# Altium footprint library 4.30-KF-5.08连接器.PcbLib: 147 footprints (part 9 of 10)
Each footprint in its own frame and in the unit in brackets; x right, y up, seen from the top. Pads: shape width x height; smd on the part's side, far side on the other; paste and mask are expansions set on the pad; w line width, h text height; cw(c..) or ccw(c..) is an arc to the next point about the centre after c.
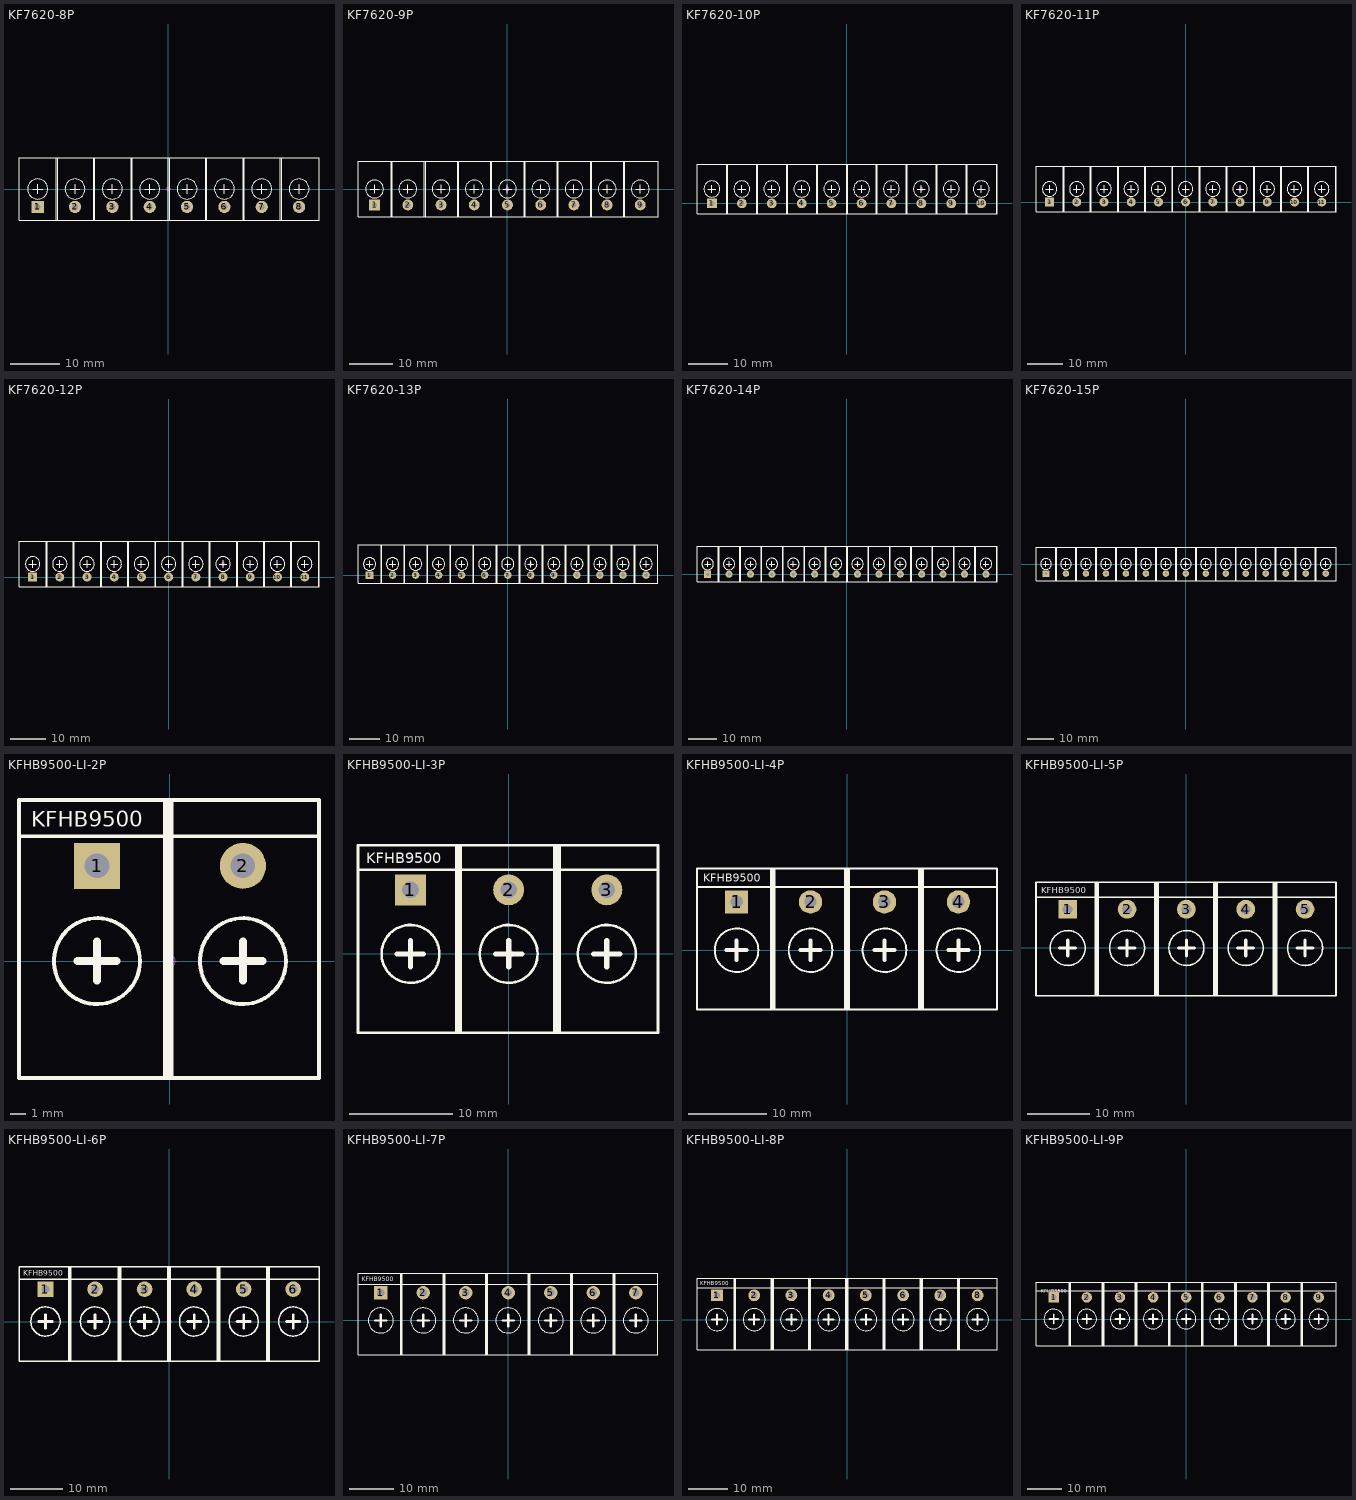
[diagram p8: the footprints below, top view; thin cyan lines are the x and y axes]

## KF7620-8P [mm] "61*12*12mm(长宽高)"
pads (8):
  rect 2.5x2.5 hole 1.2: 1(-26.67,-3.65)
  round 2.5 hole 1.2: 2(-19.05,-3.65) 3(-11.43,-3.65) 4(-3.81,-3.65) 5(3.81,-3.65) 6(11.43,-3.65) 7(19.05,-3.65) 8(26.67,-3.65)
Top Overlay:
  circle w0.254: c26.67,0 r2.048
  circle w0.254: c19.05,0 r2.048
  circle w0.254: c3.81,0 r2.048
  circle w0.254: c11.43,0 r2.048
  circle w0.254: c-19.05,0 r2.048
  circle w0.254: c-26.67,0 r2.048
  circle w0.254: c-11.43,0 r2.048
  circle w0.254: c-3.81,0 r2.048
  lines w0.254: -27.686,0 -25.654,0 ; -26.67,-1.016 -26.67,1.016 ; -22.86,-6.35 -22.86,6.35 ; -22.606,6.35 -22.606,-6.35 -22.352,-6.35 ; -20.066,0 -18.034,0 ; -19.05,-1.016 -19.05,1.016 ; -12.446,0 -10.414,0 ; -11.43,-1.016 -11.43,1.016 ; -7.62,-6.35 -7.62,6.35 ; -7.366,6.35 -7.366,-6.35 -7.112,-6.35 ; -4.826,0 -2.794,0 ; -3.81,-1.016 -3.81,1.016 ; 2.794,0 4.826,0 ; 3.81,-1.016 3.81,1.016 ; 7.62,-6.35 7.62,6.35 ; 7.874,6.35 7.874,-6.35 8.128,-6.35 ; 10.414,0 12.446,0 ; 11.43,-1.016 11.43,1.016 ; 18.034,0 20.066,0 ; 19.05,-1.016 19.05,1.016 ; 22.86,-6.35 22.86,6.35 ; 23.114,6.35 23.114,-6.35 23.368,-6.35 ; 25.654,0 27.686,0 ; 26.67,-1.016 26.67,1.016 ; -30.48,-6.35 -30.48,6.35 -14.986,6.35 -14.986,-6.35 -30.48,-6.35 ; -15.24,-6.35 0.254,-6.35 0.254,6.35 -15.24,6.35 -15.24,-6.35 ; 0,-6.35 15.494,-6.35 15.494,6.35 0,6.35 0,-6.35 ; 15.24,-6.35 15.24,6.35 30.734,6.35 30.734,-6.35 15.24,-6.35
Mechanical 15:
  circle w0.05: c0,0 r0.35
  lines w0.05: -0.5,0 0.5,0 ; 0,-0.5 0,0.5
3D body: height 12.45, standoff -3.45, extent -30.48,-6.2 -22.16,6.2
3D body: height 12.45, standoff -3.45, extent -22.86,-6.2 -14.54,6.2
3D body: height 12.45, standoff -3.45, extent -15.24,-6.2 -6.92,6.2
3D body: height 12.45, standoff -3.45, extent -7.62,-6.2 0.7,6.2
3D body: height 12.45, standoff -3.45, extent 0,-6.2 8.32,6.2
3D body: height 12.45, standoff -3.45, extent 7.62,-6.2 15.94,6.2
3D body: height 12.45, standoff -3.45, extent 15.24,-6.2 23.56,6.2
3D body: height 12.45, standoff -3.45, extent 22.86,-6.2 31.18,6.2

## KF7620-9P [mm] "61*12*12mm(长宽高)"
pads (9):
  rect 2.5x2.5 hole 1.2: 1(-30.48,-3.65)
  round 2.5 hole 1.2: 2(-22.86,-3.65) 3(-15.24,-3.65) 4(-7.62,-3.65) 5(0,-3.65) 6(7.62,-3.65) 7(15.24,-3.65) 8(22.86,-3.65) 9(30.46,-3.65)
Top Overlay:
  circle w0.254: c-7.62,0 r2.048
  circle w0.254: c-15.24,0 r2.048
  circle w0.254: c-30.48,0 r2.048
  circle w0.254: c-22.86,0 r2.048
  circle w0.254: c7.62,0 r2.048
  circle w0.254: c0,0 r2.048
  circle w0.254: c15.24,0 r2.048
  circle w0.254: c22.86,0 r2.048
  circle w0.254: c30.46,0 r2.048
  lines w0.254: -31.496,0 -29.464,0 ; -30.48,-1.016 -30.48,1.016 ; -26.67,-6.35 -26.67,6.35 ; -26.416,6.35 -26.416,-6.35 -26.162,-6.35 ; -23.876,0 -21.844,0 ; -22.86,-1.016 -22.86,1.016 ; -16.256,0 -14.224,0 ; -15.24,-1.016 -15.24,1.016 ; -11.43,-6.35 -11.43,6.35 ; -11.176,6.35 -11.176,-6.35 -10.922,-6.35 ; -8.636,0 -6.604,0 ; -7.62,-1.016 -7.62,1.016 ; -1.016,0 1.016,0 ; 0,-1.016 0,1.016 ; 3.81,-6.35 3.81,6.35 ; 4.064,6.35 4.064,-6.35 4.318,-6.35 ; 6.604,0 8.636,0 ; 7.62,-1.016 7.62,1.016 ; 14.224,0 16.256,0 ; 15.24,-1.016 15.24,1.016 ; 19.05,-6.35 19.05,6.35 ; 19.304,6.35 19.304,-6.35 19.558,-6.35 ; 21.844,0 23.876,0 ; 22.86,-1.016 22.86,1.016 ; 26.65,-6.35 26.65,6.35 ; 27.158,-6.35 26.904,-6.35 ; 29.444,0 31.476,0 ; 30.46,-1.016 30.46,1.016 ; 26.904,-6.35 26.904,6.35 34.524,6.35 34.524,-6.35 26.904,-6.35 ; 26.924,-6.35 26.924,6.35 ; 26.924,-6.35 11.43,-6.35 11.43,6.35 26.924,6.35 ; 26.924,-6.35 26.924,6.35 ; 26.924,-6.35 26.924,6.35 ; -34.29,-6.35 -18.796,-6.35 -18.796,6.35 -34.29,6.35 -34.29,-6.35 ; -19.05,-6.35 -19.05,6.35 -3.556,6.35 -3.556,-6.35 -19.05,-6.35 ; -3.81,-6.35 -3.81,6.35 11.684,6.35 11.684,-6.35 -3.81,-6.35
Mechanical 15:
  circle w0.05: c0,0 r0.35
  lines w0.05: -0.5,0 0.5,0 ; 0,-0.5 0,0.5
3D body: height 12.45, standoff -3.45, extent -34.29,-6.2 -25.97,6.2
3D body: height 12.45, standoff -3.45, extent -26.67,-6.2 -18.35,6.2
3D body: height 12.45, standoff -3.45, extent -19.05,-6.2 -10.73,6.2
3D body: height 12.45, standoff -3.45, extent -11.43,-6.2 -3.11,6.2
3D body: height 12.45, standoff -3.45, extent -3.81,-6.2 4.51,6.2
3D body: height 12.45, standoff -3.45, extent 3.81,-6.2 12.13,6.2
3D body: height 12.45, standoff -3.45, extent 11.43,-6.2 19.75,6.2
3D body: height 12.45, standoff -3.45, extent 19.05,-6.2 27.37,6.2
3D body: height 12.45, standoff -3.45, extent 26.67,-6.2 34.99,6.2

## KF7620-10P [mm] "61*12*12mm(长宽高)"
pads (10):
  rect 2.5x2.5 hole 1.2: 1(-34.29,0)
  round 2.5 hole 1.2: 2(-26.67,0) 3(-19.05,0) 4(-11.43,0) 5(-3.81,0) 6(3.81,0) 7(11.43,0) 8(19.05,0) 9(26.67,0) 10(34.29,0)
Top Overlay:
  circle w0.254: c26.67,3.65 r2.048
  circle w0.254: c34.29,3.65 r2.048
  circle w0.254: c-11.43,3.65 r2.048
  circle w0.254: c-19.05,3.65 r2.048
  circle w0.254: c-34.29,3.65 r2.048
  circle w0.254: c-26.67,3.65 r2.048
  circle w0.254: c3.81,3.65 r2.048
  circle w0.254: c-3.81,3.65 r2.048
  circle w0.254: c11.43,3.65 r2.048
  circle w0.254: c19.05,3.65 r2.048
  lines w0.254: -35.306,3.65 -33.274,3.65 ; -34.29,2.634 -34.29,4.666 ; -30.48,-2.7 -30.48,10 ; -30.226,10 -30.226,-2.7 -29.972,-2.7 ; -27.686,3.65 -25.654,3.65 ; -26.67,2.634 -26.67,4.666 ; -20.066,3.65 -18.034,3.65 ; -19.05,2.634 -19.05,4.666 ; -15.24,-2.7 -15.24,10 ; -14.986,10 -14.986,-2.7 -14.732,-2.7 ; -12.446,3.65 -10.414,3.65 ; -11.43,2.634 -11.43,4.666 ; -4.826,3.65 -2.794,3.65 ; -3.81,2.634 -3.81,4.666 ; 0,-2.7 0,10 ; 0.254,10 0.254,-2.7 0.508,-2.7 ; 2.794,3.65 4.826,3.65 ; 3.81,2.634 3.81,4.666 ; 10.414,3.65 12.446,3.65 ; 11.43,2.634 11.43,4.666 ; 15.24,-2.7 15.24,10 ; 15.494,10 15.494,-2.7 15.748,-2.7 ; 18.034,3.65 20.066,3.65 ; 19.05,2.634 19.05,4.666 ; 22.84,-2.7 22.84,10 ; 23.348,-2.7 23.094,-2.7 ; 25.654,3.65 27.686,3.65 ; 26.67,2.634 26.67,4.666 ; 30.44,-2.7 30.44,10 ; 30.948,-2.7 30.694,-2.7 ; 33.274,3.65 35.306,3.65 ; 34.29,2.634 34.29,4.666 ; 38.294,-2.7 38.294,10 ; 23.094,-2.7 23.094,10 30.714,10 ; 23.094,-2.7 30.714,-2.7 ; 30.694,-2.7 38.314,-2.7 ; 30.694,-2.7 30.694,10 38.314,10 ; 30.714,-2.7 30.714,10 ; 30.714,-2.7 30.714,10 ; 38.314,-2.7 38.314,10 ; 38.314,-2.7 38.314,10 ; -38.1,-2.7 -22.606,-2.7 -22.606,10 -38.1,10 -38.1,-2.7 ; -22.86,-2.7 -22.86,10 -7.366,10 -7.366,-2.7 -22.86,-2.7 ; -7.62,-2.7 -7.62,10 7.874,10 7.874,-2.7 -7.62,-2.7 ; 7.62,-2.7 23.114,-2.7 23.114,10 7.62,10 7.62,-2.7
Mechanical 15:
  circle w0.05: c19.05,3.65 r0.35
  lines w0.05: 18.55,3.65 19.55,3.65 ; 19.05,3.15 19.05,4.15
3D body: height 12.45, standoff -3.45, extent -38.1,-2.55 -29.78,9.85
3D body: height 12.45, standoff -3.45, extent -30.48,-2.55 -22.16,9.85
3D body: height 12.45, standoff -3.45, extent -22.86,-2.55 -14.54,9.85
3D body: height 12.45, standoff -3.45, extent -15.24,-2.55 -6.92,9.85
3D body: height 12.45, standoff -3.45, extent -7.62,-2.55 0.7,9.85
3D body: height 12.45, standoff -3.45, extent 0,-2.55 8.32,9.85
3D body: height 12.45, standoff -3.45, extent 7.62,-2.55 15.94,9.85
3D body: height 12.45, standoff -3.45, extent 15.24,-2.55 23.56,9.85
3D body: height 12.45, standoff -3.45, extent 22.86,-2.55 31.18,9.85
3D body: height 12.45, standoff -3.45, extent 30.48,-2.55 38.8,9.85

## KF7620-11P [mm] "61*12*12mm(长宽高)"
pads (11):
  rect 2.5x2.5 hole 1.2: 1(-38.1,0)
  round 2.5 hole 1.2: 2(-30.48,0) 3(-22.86,0) 4(-15.24,0) 5(-7.62,0) 6(0,0) 7(7.62,0) 8(15.24,0) 9(22.86,0) 10(30.48,0) 11(38.1,0)
Top Overlay:
  circle w0.254: c15.24,3.65 r2.048
  circle w0.254: c7.62,3.65 r2.048
  circle w0.254: c-7.62,3.65 r2.048
  circle w0.254: c0,3.65 r2.048
  circle w0.254: c-30.48,3.65 r2.048
  circle w0.254: c-38.1,3.65 r2.048
  circle w0.254: c-22.86,3.65 r2.048
  circle w0.254: c-15.24,3.65 r2.048
  circle w0.254: c30.48,3.65 r2.048
  circle w0.254: c38.1,3.65 r2.048
  circle w0.254: c22.86,3.65 r2.048
  lines w0.254: -39.116,3.65 -37.084,3.65 ; -38.1,2.634 -38.1,4.666 ; -34.29,-2.7 -34.29,10 ; -34.036,10 -34.036,-2.7 -33.782,-2.7 ; -31.496,3.65 -29.464,3.65 ; -30.48,2.634 -30.48,4.666 ; -23.876,3.65 -21.844,3.65 ; -22.86,2.634 -22.86,4.666 ; -19.05,-2.7 -19.05,10 ; -18.796,10 -18.796,-2.7 -18.542,-2.7 ; -16.256,3.65 -14.224,3.65 ; -15.24,2.634 -15.24,4.666 ; -8.636,3.65 -6.604,3.65 ; -7.62,2.634 -7.62,4.666 ; -3.81,-2.7 -3.81,10 ; -3.556,10 -3.556,-2.7 -3.302,-2.7 ; -1.016,3.65 1.016,3.65 ; 0,2.634 0,4.666 ; 6.604,3.65 8.636,3.65 ; 7.62,2.634 7.62,4.666 ; 11.43,-2.7 11.43,10 ; 11.684,10 11.684,-2.7 11.938,-2.7 ; 14.224,3.65 16.256,3.65 ; 15.24,2.634 15.24,4.666 ; 19.03,-2.7 19.03,10 ; 19.538,-2.7 19.284,-2.7 ; 21.844,3.65 23.876,3.65 ; 22.86,2.634 22.86,4.666 ; 26.63,-2.7 26.63,10 ; 27.138,-2.7 26.884,-2.7 ; 29.464,3.65 31.496,3.65 ; 30.48,2.634 30.48,4.666 ; 34.23,-2.7 34.23,10 ; 34.738,-2.7 34.484,-2.7 ; 37.084,3.65 39.116,3.65 ; 38.1,2.634 38.1,4.666 ; 42.084,-2.7 42.084,10 ; 19.284,-2.7 26.904,-2.7 ; 19.284,-2.7 19.284,10 26.904,10 ; 26.884,-2.7 26.884,10 34.504,10 ; 26.884,-2.7 34.504,-2.7 ; 26.904,-2.7 26.904,10 ; 26.904,-2.7 26.904,10 ; 34.484,-2.7 34.484,10 42.104,10 ; 34.484,-2.7 42.104,-2.7 ; 34.504,-2.7 34.504,10 ; 34.504,-2.7 34.504,10 ; 42.104,-2.7 42.104,10 ; 42.104,-2.7 42.104,10 ; -41.91,-2.7 -41.91,10 -26.416,10 -26.416,-2.7 -41.91,-2.7 ; -26.67,-2.7 -11.176,-2.7 -11.176,10 -26.67,10 -26.67,-2.7 ; -11.43,-2.7 4.064,-2.7 4.064,10 -11.43,10 -11.43,-2.7 ; 3.81,-2.7 3.81,10 19.304,10 19.304,-2.7 3.81,-2.7
Mechanical 15:
  circle w0.05: c15.24,3.65 r0.35
  lines w0.05: 14.74,3.65 15.74,3.65 ; 15.24,3.15 15.24,4.15
3D body: height 12.45, standoff -3.45, extent 26.67,-2.55 34.99,9.85
3D body: height 12.45, standoff -3.45, extent 19.05,-2.55 27.37,9.85
3D body: height 12.45, standoff -3.45, extent 11.43,-2.55 19.75,9.85
3D body: height 12.45, standoff -3.45, extent 3.81,-2.55 12.13,9.85
3D body: height 12.45, standoff -3.45, extent -3.81,-2.55 4.51,9.85
3D body: height 12.45, standoff -3.45, extent -11.43,-2.55 -3.11,9.85
3D body: height 12.45, standoff -3.45, extent -19.05,-2.55 -10.73,9.85
3D body: height 12.45, standoff -3.45, extent -26.67,-2.55 -18.35,9.85
3D body: height 12.45, standoff -3.45, extent -34.29,-2.55 -25.97,9.85
3D body: height 12.45, standoff -3.45, extent -41.91,-2.55 -33.59,9.85
3D body: height 12.45, standoff -3.45, extent 34.29,-2.55 42.61,9.85

## KF7620-12P [mm] "61*12*12mm(长宽高)"
pads (11):
  rect 2.5x2.5 hole 1.2: 1(-38.1,0)
  round 2.5 hole 1.2: 2(-30.48,0) 3(-22.86,0) 4(-15.24,0) 5(-7.62,0) 6(0,0) 7(7.62,0) 8(15.24,0) 9(22.86,0) 10(30.48,0) 11(38.1,0)
Top Overlay:
  circle w0.254: c22.86,3.65 r2.048
  circle w0.254: c38.1,3.65 r2.048
  circle w0.254: c30.48,3.65 r2.048
  circle w0.254: c-15.24,3.65 r2.048
  circle w0.254: c-22.86,3.65 r2.048
  circle w0.254: c-38.1,3.65 r2.048
  circle w0.254: c-30.48,3.65 r2.048
  circle w0.254: c0,3.65 r2.048
  circle w0.254: c-7.62,3.65 r2.048
  circle w0.254: c7.62,3.65 r2.048
  circle w0.254: c15.24,3.65 r2.048
  lines w0.254: -39.116,3.65 -37.084,3.65 ; -38.1,2.634 -38.1,4.666 ; -34.29,-2.7 -34.29,10 ; -34.036,10 -34.036,-2.7 -33.782,-2.7 ; -31.496,3.65 -29.464,3.65 ; -30.48,2.634 -30.48,4.666 ; -23.876,3.65 -21.844,3.65 ; -22.86,2.634 -22.86,4.666 ; -19.05,-2.7 -19.05,10 ; -18.796,10 -18.796,-2.7 -18.542,-2.7 ; -16.256,3.65 -14.224,3.65 ; -15.24,2.634 -15.24,4.666 ; -8.636,3.65 -6.604,3.65 ; -7.62,2.634 -7.62,4.666 ; -3.81,-2.7 -3.81,10 ; -3.556,10 -3.556,-2.7 -3.302,-2.7 ; -1.016,3.65 1.016,3.65 ; 0,2.634 0,4.666 ; 6.604,3.65 8.636,3.65 ; 7.62,2.634 7.62,4.666 ; 11.43,-2.7 11.43,10 ; 11.684,10 11.684,-2.7 11.938,-2.7 ; 14.224,3.65 16.256,3.65 ; 15.24,2.634 15.24,4.666 ; 19.03,-2.7 19.03,10 ; 19.538,-2.7 19.284,-2.7 ; 21.844,3.65 23.876,3.65 ; 22.86,2.634 22.86,4.666 ; 26.63,-2.7 26.63,10 ; 27.138,-2.7 26.884,-2.7 ; 29.464,3.65 31.496,3.65 ; 30.48,2.634 30.48,4.666 ; 34.23,-2.7 34.23,10 ; 34.738,-2.7 34.484,-2.7 ; 37.084,3.65 39.116,3.65 ; 38.1,2.634 38.1,4.666 ; 42.084,-2.7 42.084,10 ; 19.284,-2.7 19.284,10 26.904,10 ; 19.284,-2.7 26.904,-2.7 ; 26.884,-2.7 34.504,-2.7 ; 26.884,-2.7 26.884,10 34.504,10 ; 26.904,-2.7 26.904,10 ; 26.904,-2.7 26.904,10 ; 34.484,-2.7 42.104,-2.7 ; 34.484,-2.7 34.484,10 42.104,10 ; 34.504,-2.7 34.504,10 ; 34.504,-2.7 34.504,10 ; 42.104,-2.7 42.104,10 ; 42.104,-2.7 42.104,10 ; -41.91,-2.7 -26.416,-2.7 -26.416,10 -41.91,10 -41.91,-2.7 ; -26.67,-2.7 -26.67,10 -11.176,10 -11.176,-2.7 -26.67,-2.7 ; -11.43,-2.7 -11.43,10 4.064,10 4.064,-2.7 -11.43,-2.7 ; 3.81,-2.7 19.304,-2.7 19.304,10 3.81,10 3.81,-2.7
Mechanical 15:
  circle w0.05: c15.24,3.65 r0.35
  lines w0.05: 14.74,3.65 15.74,3.65 ; 15.24,3.15 15.24,4.15
3D body: height 12.45, standoff -3.45, extent 34.29,-2.55 42.61,9.85
3D body: height 12.45, standoff -3.45, extent -41.91,-2.55 -33.59,9.85
3D body: height 12.45, standoff -3.45, extent -34.29,-2.55 -25.97,9.85
3D body: height 12.45, standoff -3.45, extent -26.67,-2.55 -18.35,9.85
3D body: height 12.45, standoff -3.45, extent -19.05,-2.55 -10.73,9.85
3D body: height 12.45, standoff -3.45, extent -11.43,-2.55 -3.11,9.85
3D body: height 12.45, standoff -3.45, extent -3.81,-2.55 4.51,9.85
3D body: height 12.45, standoff -3.45, extent 3.81,-2.55 12.13,9.85
3D body: height 12.45, standoff -3.45, extent 11.43,-2.55 19.75,9.85
3D body: height 12.45, standoff -3.45, extent 19.05,-2.55 27.37,9.85
3D body: height 12.45, standoff -3.45, extent 26.67,-2.55 34.99,9.85

## KF7620-13P [mm] "61*12*12mm(长宽高)"
pads (13):
  rect 2.5x2.5 hole 1.2: 1(-45.72,0)
  round 2.5 hole 1.2: 2(-38.1,0) 3(-30.48,0) 4(-22.86,0) 5(-15.24,0) 6(-7.62,0) 7(0,0) 8(7.62,0) 9(15.24,0) 10(22.86,0) 11(30.48,0) 12(38.1,0) 13(45.72,0)
Top Overlay:
  circle w0.254: c15.24,3.65 r2.048
  circle w0.254: c30.48,3.65 r2.048
  circle w0.254: c22.86,3.65 r2.048
  circle w0.254: c38.1,3.65 r2.048
  circle w0.254: c45.72,3.65 r2.048
  circle w0.254: c-22.86,3.65 r2.048
  circle w0.254: c-30.48,3.65 r2.048
  circle w0.254: c-45.72,3.65 r2.048
  circle w0.254: c-38.1,3.65 r2.048
  circle w0.254: c-7.62,3.65 r2.048
  circle w0.254: c-15.24,3.65 r2.048
  circle w0.254: c0,3.65 r2.048
  circle w0.254: c7.62,3.65 r2.048
  lines w0.254: -46.736,3.65 -44.704,3.65 ; -45.72,2.634 -45.72,4.666 ; -41.91,-2.7 -41.91,10 ; -41.656,10 -41.656,-2.7 -41.402,-2.7 ; -39.116,3.65 -37.084,3.65 ; -38.1,2.634 -38.1,4.666 ; -31.496,3.65 -29.464,3.65 ; -30.48,2.634 -30.48,4.666 ; -26.67,-2.7 -26.67,10 ; -26.416,10 -26.416,-2.7 -26.162,-2.7 ; -23.876,3.65 -21.844,3.65 ; -22.86,2.634 -22.86,4.666 ; -16.256,3.65 -14.224,3.65 ; -15.24,2.634 -15.24,4.666 ; -11.43,-2.7 -11.43,10 ; -11.176,10 -11.176,-2.7 -10.922,-2.7 ; -8.636,3.65 -6.604,3.65 ; -7.62,2.634 -7.62,4.666 ; -1.016,3.65 1.016,3.65 ; 0,2.634 0,4.666 ; 3.81,-2.7 3.81,10 ; 4.064,10 4.064,-2.7 4.318,-2.7 ; 6.604,3.65 8.636,3.65 ; 7.62,2.634 7.62,4.666 ; 11.41,-2.7 11.41,10 ; 11.918,-2.7 11.664,-2.7 ; 14.224,3.65 16.256,3.65 ; 15.24,2.634 15.24,4.666 ; 19.01,-2.7 19.01,10 ; 19.518,-2.7 19.264,-2.7 ; 21.844,3.65 23.876,3.65 ; 22.86,2.634 22.86,4.666 ; 26.61,-2.7 26.61,10 ; 27.118,-2.7 26.864,-2.7 ; 29.464,3.65 31.496,3.65 ; 30.48,2.634 30.48,4.666 ; 34.21,-2.7 34.21,10 ; 34.718,-2.7 34.464,-2.7 ; 37.084,3.65 39.116,3.65 ; 38.1,2.634 38.1,4.666 ; 41.81,-2.7 41.81,10 ; 42.318,-2.7 42.064,-2.7 ; 44.704,3.65 46.736,3.65 ; 45.72,2.634 45.72,4.666 ; 49.664,-2.7 49.664,10 ; 11.664,-2.7 11.664,10 19.284,10 ; 11.664,-2.7 19.284,-2.7 ; 19.264,-2.7 26.884,-2.7 ; 19.264,-2.7 19.264,10 26.884,10 ; 19.284,-2.7 19.284,10 ; 19.284,-2.7 19.284,10 ; 26.864,-2.7 34.484,-2.7 ; 26.864,-2.7 26.864,10 34.484,10 ; 26.884,-2.7 26.884,10 ; 26.884,-2.7 26.884,10 ; 34.464,-2.7 42.084,-2.7 ; 34.464,-2.7 34.464,10 42.084,10 ; 34.484,-2.7 34.484,10 ; 34.484,-2.7 34.484,10 ; 42.064,-2.7 49.684,-2.7 ; 42.064,-2.7 42.064,10 49.684,10 ; 42.084,-2.7 42.084,10 ; 42.084,-2.7 42.084,10 ; 49.684,-2.7 49.684,10 ; 49.684,-2.7 49.684,10 ; 49.684,-2.7 49.684,10 ; -49.53,-2.7 -34.036,-2.7 -34.036,10 -49.53,10 -49.53,-2.7 ; -34.29,-2.7 -34.29,10 -18.796,10 -18.796,-2.7 -34.29,-2.7 ; -19.05,-2.7 -19.05,10 -3.556,10 -3.556,-2.7 -19.05,-2.7 ; -3.81,-2.7 11.684,-2.7 11.684,10 -3.81,10 -3.81,-2.7
Mechanical 15:
  circle w0.05: c7.62,3.65 r0.35
  lines w0.05: 7.12,3.65 8.12,3.65 ; 7.62,3.15 7.62,4.15
3D body: height 12.45, standoff -3.45, extent 41.91,-2.55 50.23,9.85
3D body: height 12.45, standoff -3.45, extent 34.29,-2.55 42.61,9.85
3D body: height 12.45, standoff -3.45, extent 26.67,-2.55 34.99,9.85
3D body: height 12.45, standoff -3.45, extent -49.53,-2.55 -41.21,9.85
3D body: height 12.45, standoff -3.45, extent -41.91,-2.55 -33.59,9.85
3D body: height 12.45, standoff -3.45, extent -34.29,-2.55 -25.97,9.85
3D body: height 12.45, standoff -3.45, extent -26.67,-2.55 -18.35,9.85
3D body: height 12.45, standoff -3.45, extent -19.05,-2.55 -10.73,9.85
3D body: height 12.45, standoff -3.45, extent -11.43,-2.55 -3.11,9.85
3D body: height 12.45, standoff -3.45, extent -3.81,-2.55 4.51,9.85
3D body: height 12.45, standoff -3.45, extent 3.81,-2.55 12.13,9.85
3D body: height 12.45, standoff -3.45, extent 11.43,-2.55 19.75,9.85
3D body: height 12.45, standoff -3.45, extent 19.05,-2.55 27.37,9.85

## KF7620-14P [mm] "61*12*12mm(长宽高)            淘宝ID:黄晶宝石"
pads (14):
  rect 2.5x2.5 hole 1.2: 1(-49.53,0)
  round 2.5 hole 1.2: 2(-41.91,0) 3(-34.29,0) 4(-26.67,0) 5(-19.05,0) 6(-11.43,0) 7(-3.81,0) 8(3.81,0) 9(11.43,0) 10(19.05,0) 11(26.67,0) 12(34.29,0) 13(41.91,0) 14(49.53,0)
Top Overlay:
  circle w0.254: c11.43,3.65 r2.048
  circle w0.254: c26.67,3.65 r2.048
  circle w0.254: c19.05,3.65 r2.048
  circle w0.254: c34.29,3.65 r2.048
  circle w0.254: c41.91,3.65 r2.048
  circle w0.254: c49.53,3.65 r2.048
  circle w0.254: c-26.67,3.65 r2.048
  circle w0.254: c-34.29,3.65 r2.048
  circle w0.254: c-49.53,3.65 r2.048
  circle w0.254: c-41.91,3.65 r2.048
  circle w0.254: c-11.43,3.65 r2.048
  circle w0.254: c-19.05,3.65 r2.048
  circle w0.254: c-3.81,3.65 r2.048
  circle w0.254: c3.81,3.65 r2.048
  lines w0.254: -50.546,3.65 -48.514,3.65 ; -49.53,2.634 -49.53,4.666 ; -45.72,-2.7 -45.72,10 ; -45.466,10 -45.466,-2.7 -45.212,-2.7 ; -42.926,3.65 -40.894,3.65 ; -41.91,2.634 -41.91,4.666 ; -35.306,3.65 -33.274,3.65 ; -34.29,2.634 -34.29,4.666 ; -30.48,-2.7 -30.48,10 ; -30.226,10 -30.226,-2.7 -29.972,-2.7 ; -27.686,3.65 -25.654,3.65 ; -26.67,2.634 -26.67,4.666 ; -20.066,3.65 -18.034,3.65 ; -19.05,2.634 -19.05,4.666 ; -15.24,-2.7 -15.24,10 ; -14.986,10 -14.986,-2.7 -14.732,-2.7 ; -12.446,3.65 -10.414,3.65 ; -11.43,2.634 -11.43,4.666 ; -4.826,3.65 -2.794,3.65 ; -3.81,2.634 -3.81,4.666 ; 0,-2.7 0,10 ; 0.254,10 0.254,-2.7 0.508,-2.7 ; 2.794,3.65 4.826,3.65 ; 3.81,2.634 3.81,4.666 ; 7.6,-2.7 7.6,10 ; 8.108,-2.7 7.854,-2.7 ; 10.414,3.65 12.446,3.65 ; 11.43,2.634 11.43,4.666 ; 15.2,-2.7 15.2,10 ; 15.708,-2.7 15.454,-2.7 ; 18.034,3.65 20.066,3.65 ; 19.05,2.634 19.05,4.666 ; 22.8,-2.7 22.8,10 ; 23.308,-2.7 23.054,-2.7 ; 25.654,3.65 27.686,3.65 ; 26.67,2.634 26.67,4.666 ; 30.4,-2.7 30.4,10 ; 30.908,-2.7 30.654,-2.7 ; 33.274,3.65 35.306,3.65 ; 34.29,2.634 34.29,4.666 ; 38,-2.7 38,10 ; 38.508,-2.7 38.254,-2.7 ; 40.894,3.65 42.926,3.65 ; 41.91,2.634 41.91,4.666 ; 45.6,-2.7 45.6,10 ; 46.108,-2.7 45.854,-2.7 ; 48.514,3.65 50.546,3.65 ; 49.53,2.634 49.53,4.666 ; 53.454,-2.7 53.454,10 ; 7.854,-2.7 7.854,10 15.474,10 ; 7.854,-2.7 15.474,-2.7 ; 15.454,-2.7 23.074,-2.7 ; 15.454,-2.7 15.454,10 23.074,10 ; 15.474,-2.7 15.474,10 ; 15.474,-2.7 15.474,10 ; 23.054,-2.7 30.674,-2.7 ; 23.054,-2.7 23.054,10 30.674,10 ; 23.074,-2.7 23.074,10 ; 23.074,-2.7 23.074,10 ; 30.654,-2.7 38.274,-2.7 ; 30.654,-2.7 30.654,10 38.274,10 ; 30.674,-2.7 30.674,10 ; 30.674,-2.7 30.674,10 ; 38.254,-2.7 45.874,-2.7 ; 38.254,-2.7 38.254,10 45.874,10 ; 38.274,-2.7 38.274,10 ; 38.274,-2.7 38.274,10 ; 45.854,-2.7 45.854,10 53.474,10 ; 45.854,-2.7 53.474,-2.7 ; 45.874,-2.7 45.874,10 ; 45.874,-2.7 45.874,10 ; 45.874,-2.7 45.874,10 ; 53.474,-2.7 53.474,10 ; 53.474,-2.7 53.474,10 ; 53.474,-2.7 53.474,10 ; 53.474,-2.7 53.474,10 ; -53.34,-2.7 -37.846,-2.7 -37.846,10 -53.34,10 -53.34,-2.7 ; -38.1,-2.7 -38.1,10 -22.606,10 -22.606,-2.7 -38.1,-2.7 ; -22.86,-2.7 -22.86,10 -7.366,10 -7.366,-2.7 -22.86,-2.7 ; -7.62,-2.7 7.874,-2.7 7.874,10 -7.62,10 -7.62,-2.7